# Altium footprint library master.PcbLib: 98 footprints (part 4 of 7)
Each footprint in its own frame and in the unit in brackets; x right, y up, seen from the top. Pads: shape width x height; smd on the part's side, far side on the other; paste and mask are expansions set on the pad; w line width, h text height; cw(c..) or ccw(c..) is an arc to the next point about the centre after c.
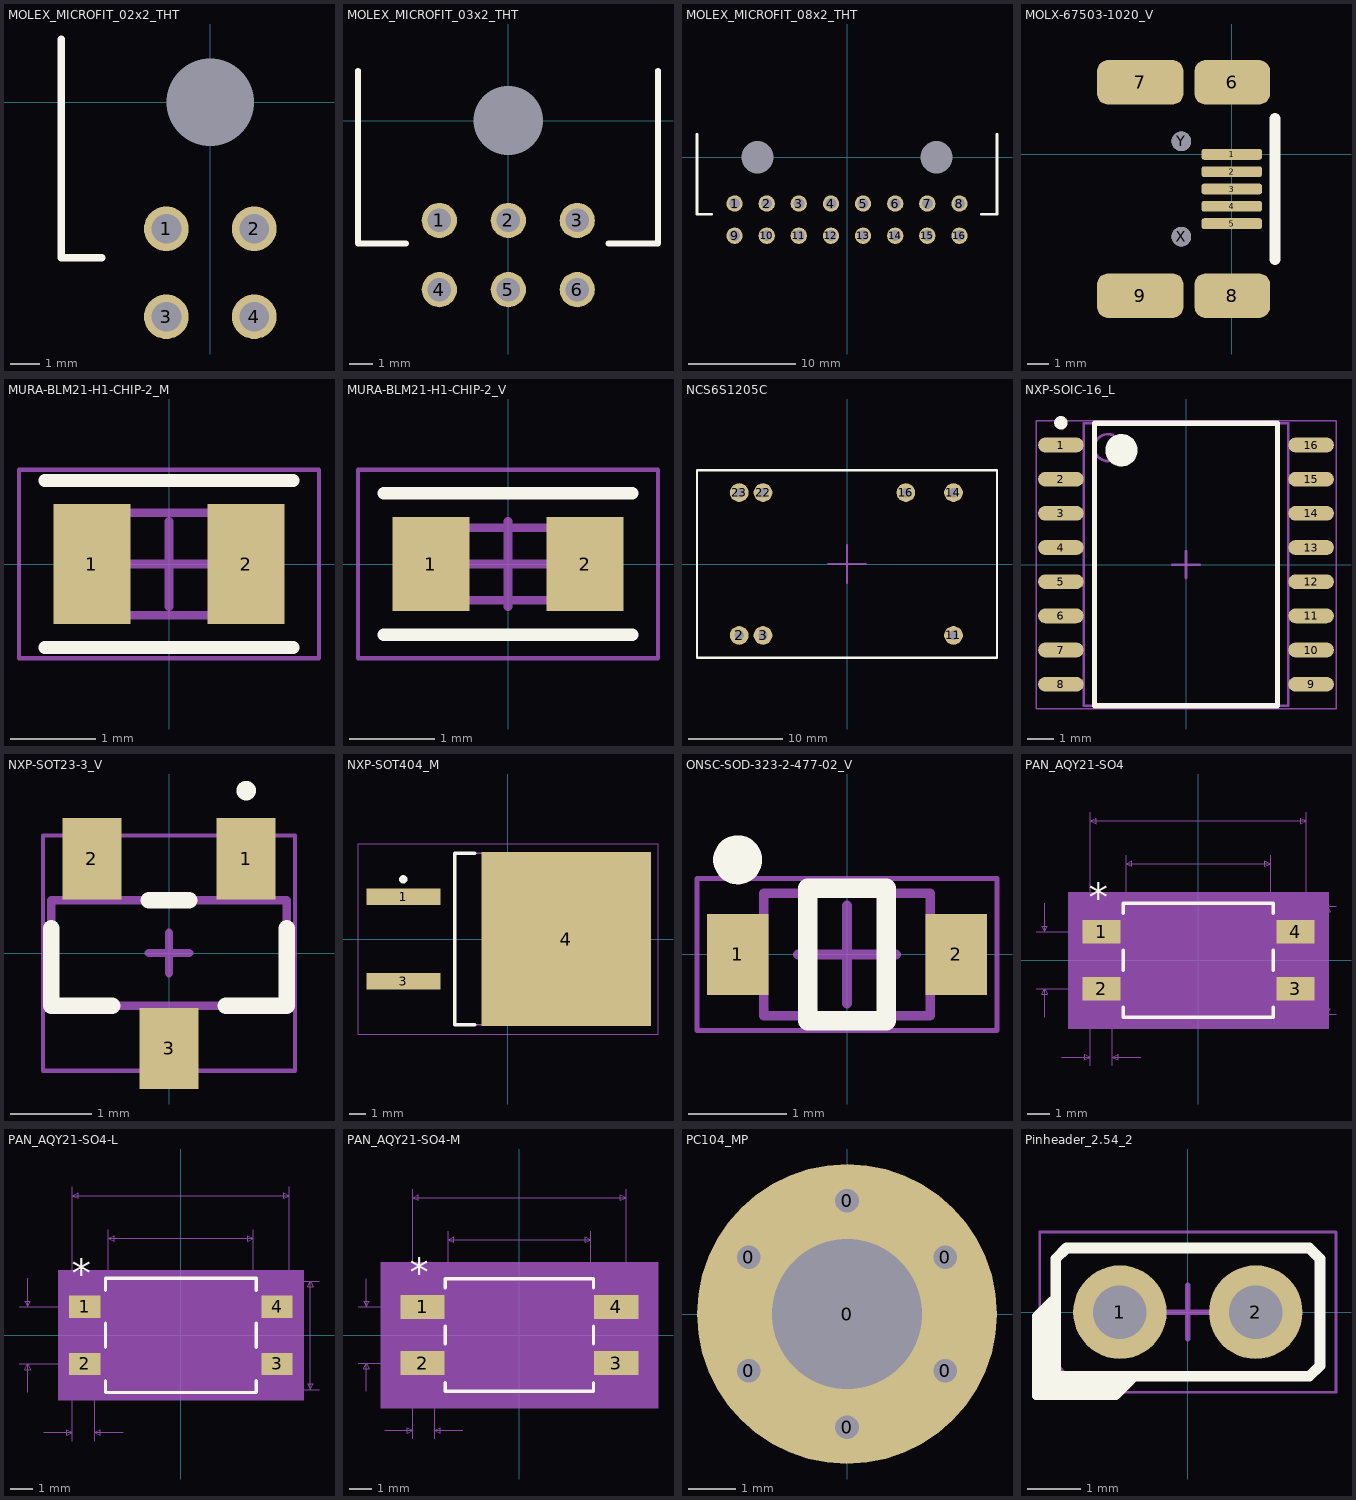
[diagram p3: the footprints below, top view; thin cyan lines are the x and y axes]

## MOLEX_MICROFIT_02x2_THT [mil] "Micro-Fit 3.0 Right Angle Header, 3.00mm Pitch, Dual Row, 4 Circuits, with Snap-in Plastic Peg PCB Lock, Tin, Glow Wire Capable, Black, 43045-0400"
height 345
pads (5):
  round 60 hole 40: 1(-59.02,-170) 2(59.02,-170) 3(-59.02,-287.99) 4(59.02,-287.99)
  round 39.37 hole 117.99 unplated paste+0 mask+4: ""(0,0)
Top Overlay:
  lines w10: -200,85 -200,-209.02 -146.02,-209.02
3D body "430450400.stp": height 345.35, standoff -125.12, extent -199.8,-300.95 199.8,180.94

## MOLEX_MICROFIT_03x2_THT [mil] "Micro-Fit 3.0 Right Angle Header, 3.00mm Pitch, Dual Row, 6 Circuits, with Snap-in Plastic Peg PCB Lock, Tin, Glow Wire Capable, Black, 43045-0600"
height 345
pads (7):
  round 60 hole 40: 1(-117.48,-170) 2(0,-170) 3(117.48,-170) 4(-117.48,-287.99) 5(0,-287.99) 6(117.48,-287.99)
  round 39.37 hole 117.99 unplated paste+0 mask+4: ""(0,0)
Top Overlay:
  lines w10: -256,85 -256,-209.02 -174,-209.02 ; 171,-209.02 255,-209.02 255,85
3D body "430450600.stp": height 345.35, standoff -125.12, extent -258.86,-300.95 258.86,180.94

## MOLEX_MICROFIT_08x2_THT [mil] "Micro-Fit 3.0 Right Angle Header, 3.00mm Pitch, Dual Row, 16 Circuits, with Snap-in Plastic Peg PCB Lock, Tin, Glow Wire Capable, Black, 43045-1600"
height 345
pads (18):
  round 60 hole 40: 1(-412.99,-170) 2(-295,-170) 3(-177.01,-170) 4(-59.02,-170) 5(59.02,-170) 6(177.01,-170) 7(295,-170) 8(412.99,-170) 9(-412.99,-287.99) 10(-295,-287.99) 11(-177.01,-287.99) 12(-59.02,-287.99) 13(59.02,-287.99) 14(177.01,-287.99) 15(295,-287.99) 16(412.99,-287.99)
  round 39.37 hole 117.99 unplated paste+0 mask+4: ""(-328.5,0) ""(328.5,0)
Top Overlay:
  lines w10: -551,85 -551,-209.02 -497,-209.02 ; 494,-209.02 551,-209.02 551,85
3D body "430451600.stp": height 345.35, standoff -125.12, extent -554.13,-300.95 554.13,180.94

## MOLX-67503-1020_V [mm] "Mini USB Connector, SMT, Righer Angle"
pads (11):
  rrect50% 2.8x0.5 smd: 1(0,0) 2(0,-0.8) 3(0,-1.6) 4(0,-2.4) 5(0,-3.2)
  rrect50% 3.5x2.05 smd: 6(0.025,3.325) 8(0.025,-6.525)
  rrect50% 4x2.05 smd: 7(-4.225,3.325) 9(-4.225,-6.525)
  round 0.9 hole 0.9 unplated: X(-2.325,-3.8) Y(-2.325,0.6)
Top Overlay:
  lines w0.5: 2,-4.85 2,1.65
3D body "USB Mini B - Connector.stp": height 3.95, standoff -1, extent -8.217,-6.557 0.783,3.343

## MURA-BLM21-H1-CHIP-2_M [mm] "Chip Ferrite Bead, 2-Leads, Body 2x1.25mm, Height 1.05mm Medium Density"
height 1.05
pads (2):
  rect 0.9x1.4 smd paste-10: 1(-0.9,0) 2(0.9,0)
Top Overlay:
  lines w0.15: -1.45,-0.975 1.45,-0.975 ; -1.45,0.975 1.45,0.975
Top Paste:
  region: 1.325,-0.675 1.325,0.675 0.729,0.675 0.45,0 0.729,-0.675
  region: -1.325,0.675 -1.325,-0.675 -0.729,-0.675 -0.45,0 -0.729,0.675
Mechanical 13:
  lines w0.1: -1,-0.6 1,-0.6 1,0.6 -1,0.6 -1,-0.6
Mechanical 15:
  lines w0.05: -1.75,-1.1 1.75,-1.1 1.75,1.1 -1.75,1.1 -1.75,-1.1
  lines w0.1: -0.5,0 0.5,0 ; 0,-0.5 0,0.5
3D body: height 0.85, standoff 0.05, extent -0.5,-0.6 0.5,0.6
3D body: height 0.9, standoff 0, extent -1,-0.625 -0.5,0.625
3D body: height 0.85, standoff 0, extent 0.5,-0.625 1,0.625

## MURA-BLM21-H1-CHIP-2_V [mm] "Chip Ferrite Bead, 2-Leads, Body 2x1.25mm, Height 1.05mm"
height 1.25
pads (2):
  rect 0.9x1.1 smd paste-10: 1(-0.9,0) 2(0.9,0)
Top Overlay:
  lines w0.15: -1.45,-0.825 1.45,-0.825 ; -1.45,0.825 1.45,0.825
Top Paste:
  region: -1.325,0.525 -1.325,-0.525 -0.667,-0.525 -0.45,0 -0.667,0.525
  region: 1.325,-0.525 1.325,0.525 0.667,0.525 0.45,0 0.667,-0.525
Mechanical 13:
  lines w0.1: -1,-0.425 -1,0.425 1,0.425 1,-0.425 -1,-0.425
Mechanical 15:
  lines w0.05: -1.75,-1.1 -1.75,1.1 1.75,1.1 1.75,-1.1 -1.75,-1.1
  lines w0.1: -0.5,0 0.5,0 ; 0,-0.5 0,0.5
3D body: height 1.2, standoff 0.05, extent -0.5,-0.4 0.5,0.4
3D body: height 1.25, standoff 0, extent 0.5,-0.425 1,0.425
3D body: height 1.25, standoff 0, extent -1,-0.425 -0.5,0.425

## NCS6S1205C [mm] "Isolated 6W 4:1 Input Single Output DC/DC Converter"
height 10.5
pads (7):
  round 2 hole 1: 2(-11.5,-7.62) 3(-8.96,-7.62) 11(11.36,-7.62) 14(11.36,7.62) 16(6.28,7.62) 22(-8.96,7.62) 23(-11.5,7.62)
Top Overlay:
  lines w0.254: -16,-10 16,-10 16,10 -16,10 -16,-10
Mechanical 15:
  lines w0.254: -2,0 -1.5,0 1.5,0 2,0 ; 0,-2 0,2
3D body "mps_dcdc_ncs6s_a.step": height 10.62, standoff -6.5, extent -16,-10 16,10

## NXP-SOIC-16_L [mm] "SOIC, 16-Leads, Body 10.5x7.6mm, Pitch 1.27mm, IPC High Density"
height 2.65
pads (16):
  oval 1.7x0.55 smd: 1(-4.65,4.445) 2(-4.65,3.175) 3(-4.65,1.905) 4(-4.65,0.635) 5(-4.65,-0.635) 6(-4.65,-1.905) 7(-4.65,-3.175) 8(-4.65,-4.445) 9(4.65,-4.445) 10(4.65,-3.175) 11(4.65,-1.905) 12(4.65,-0.635) 13(4.65,0.635) 14(4.65,1.905) 15(4.65,3.175) 16(4.65,4.445)
Top Overlay:
  circle w0.6: c-2.4,4.25 r0.3
  circle w0.25: c-4.65,5.27 r0.125
  lines w0.2: -3.4,-5.25 3.4,-5.25 3.4,5.25 -3.4,5.25 -3.4,-5.25
Mechanical 13:
  circle w0.1: c-2.9,4.35 r0.5
  lines w0.1: -3.8,-5.25 3.8,-5.25 3.8,5.25 -3.8,5.25 -3.8,-5.25
Mechanical 15:
  lines w0.05: -5.575,-5.35 5.575,-5.35 5.575,5.35 -5.575,5.35 -5.575,-5.35
  lines w0.1: -0.5,0 0.5,0 ; 0,-0.5 0,0.5
3D body "SOIC127P1030X265-16L.step": height 2.65, standoff 0, extent -5.162,-5.25 5.162,5.25

## NXP-SOT23-3_V [mm] "SOT23, 3-Leads, Body 1.3x2.9mm, Pitch 0.95mm"
height 1.1
pads (3):
  rect 0.725x1 smd: 1(0.95,1.16) 2(-0.95,1.16) 3(0,-1.175)
Top Overlay:
  circle w0.2: c0.95,2 r0.02
  lines w0.2: -1.45,0.304 -1.45,-0.65 -0.7,-0.65 ; -0.25,0.65 0.25,0.65 ; 0.7,-0.65 1.45,-0.65 1.45,0.304
Mechanical 13:
  lines w0.1: -1.45,-0.65 -1.45,0.65 1.45,0.65 1.45,-0.65 -1.45,-0.65
Mechanical 15:
  lines w0.05: -1.55,-1.45 1.55,-1.45 1.55,1.45 -1.55,1.45 -1.55,-1.45
  lines w0.1: -0.25,0 0.25,0 ; 0,-0.25 0,0.25
3D body: height 0.15, standoff 0, extent -0.225,-1.375 0.225,-0.875
3D body: height 1, standoff 0.05, extent -1.45,-0.65 1.45,0.65
3D body: height 0.5, standoff 0.35, extent -0.225,-0.875 0.225,-0.65
3D body: height 0.5, standoff 0, extent -0.225,-1.1 0.225,-0.875
3D body: height 0.5, standoff 0, extent 0.725,0.875 1.175,1.1
3D body: height 0.5, standoff 0.35, extent 0.725,0.65 1.175,0.875
3D body: height 0.15, standoff 0, extent 0.725,0.875 1.175,1.375
3D body: height 0.5, standoff 0, extent -1.175,0.875 -0.725,1.1
3D body: height 0.5, standoff 0.35, extent -1.175,0.65 -0.725,0.875
3D body: height 0.15, standoff 0, extent -1.175,0.875 -0.725,1.375

## NXP-SOT404_M [mm] "DPAK, 3-Leads, Body 10.3x9.8mm, Pitch 2.54mm, IPC Low Density"
height 4.5
pads (3):
  rect 4.45x1 smd: 1(-6.3,2.54) 3(-6.3,-2.54)
  rect 10.2x10.45 smd: 4(3.5,0)
Top Overlay:
  circle w0.25: c-6.3,3.59 r0.125
  lines w0.2: -2,-5.15 -3.2,-5.15 -3.2,5.15 -2,5.15
Mechanical 13:
  lines w0.1: -3.2,-5.15 6.6,-5.15 6.6,5.15 -3.2,5.15 -3.2,-5.15
Mechanical 15:
  lines w0.05: -9.025,-5.725 -9.025,5.725 9.025,5.725 9.025,-5.725 -9.025,-5.725
  lines w0.1: -0.5,0 0.5,0 ; 0,-0.5 0,0.5
3D body: height 4.5, standoff 0, extent -3.2,-5.15 6.6,5.15

## ONSC-SOD-323-2-477-02_V [mm] "SOD, 2-Leads, Body 1.7x1.25mm"
height 1.062
pads (2):
  rect 0.63x0.83 smd: 1(-1.115,0) 2(1.115,0)
Top Overlay:
  circle w0.25: c-1.115,0.965 r0.125
  lines w0.2: -0.4,-0.675 -0.4,0.675 0.4,0.675 0.4,-0.675 -0.4,-0.675
Mechanical 13:
  lines w0.1: -0.85,-0.625 -0.85,0.625 0.85,0.625 0.85,-0.625 -0.85,-0.625
Mechanical 15:
  lines w0.05: -1.53,-0.775 -1.53,0.775 1.53,0.775 1.53,-0.775 -1.53,-0.775
  lines w0.1: -0.5,0 0.5,0 ; 0,-0.5 0,0.5
3D body: height 1.06, standoff 0, extent -0.85,-0.625 0.85,0.625

## PAN_AQY21-SO4 [mil]
pads (4):
  rect 67x41 smd paste+0 mask+0: 1(-170.5,50) 2(-170.5,-50) 3(170.5,-50) 4(170.5,50)
Top Overlay:
  lines w6: -132,-82.61 -132,-100 132,-100 132,-82.61 ; -132,-17.39 -132,17.39 ; -132,82.61 -132,100 132,100 132,82.61 ; 132,-17.39 132,17.39
  text "*" at -193,86 h50
Mechanical 5:
  region: 229,-120 -229,-120 -229,120 229,120
Mechanical 7:
  lines w1: -285.5,-50 -170.5,-50 ; -285.5,50 -170.5,50 ; -270.5,-100 -270.5,-50 ; -270.5,100 -270.5,50 ; -240,-170 -190,-170 ; -190,-185 -190,0 -190,260 ; -151,-185 -151,0 ; -127,0 -127,185 ; -101,-170 -151,-170 ; 0,-95 242,-95 ; 0,95 242,95 ; 127,0 127,185 ; 190,0 190,260 ; -270.5,-50 -275.5,-60 -265.5,-60 -270.5,-50 ; -270.5,50 -275.5,60 -265.5,60 -270.5,50 ; -190,-170 -200,-165 -200,-175 -190,-170 ; -190,245 190,245 ; -190,245 -180,250 -180,240 -190,245 ; -151,-170 -141,-165 -141,-175 -151,-170 ; -127,170 127,170 ; -127,170 -117,175 -117,165 -127,170 ; 127,170 117,175 117,165 127,170 ; 190,245 180,250 180,240 190,245 ; 227,-95 227,95 ; 227,-95 222,-85 232,-85 227,-95 ; 227,95 222,85 232,85 227,95
  text "Default Padstyle: RX67Y41D0T" at -350,-295 h50
  text "Pin One Padstyle: RX67Y41D0T" at -350,-355 h50
  text "Alt 1 Padstyle: OX60Y90D30P" at -337.5,-535 h50
  text "Alt 2 Padstyle: OX90Y60D30P" at -337.5,-595 h50
  text "0.254in/6.452mm" at -93.75,190 h25
  text "0.38in/9.652mm" at -87.5,265 h25
  text "0.19in/4.826mm" at 247,-12.5 h25
  text "0.1in/2.54mm" at -440.5,-12.5 h25
  text "0.039in/0.991mm" at -264.25,-215 h25
Mechanical 13:
  lines w0: -12,95 ccw(c0,95) 12,95
  lines w1: -190,-69.5 -190,-30.5 -127,-30.5 -127,-69.5 -190,-69.5 ; -190,30.5 -190,69.5 -127,69.5 -127,30.5 -190,30.5 ; -127,-95 127,-95 127,95 -127,95 -127,-95 ; 127,-69.5 127,-30.5 190,-30.5 190,-69.5 127,-69.5 ; 127,30.5 127,69.5 190,69.5 190,30.5 127,30.5
  text "*" at -124.5,42 h50
Mechanical 15:
  region: -137,-80.5 -214,-80.5 -214,80.5 -137,80.5 -137,105 137,105 137,80.5 214,80.5 214,-80.5 137,-80.5 137,-105 -137,-105
  lines w6: -214,-80.5 -214,80.5 -137,80.5 -137,105 137,105 137,80.5 214,80.5 214,-80.5 137,-80.5 137,-105 -137,-105 -137,-80.5 -214,-80.5
3D body "PAN_AQY21-SO4.step": height 136.1, standoff 0, extent -189.99,-94.99 190.01,95
3D body: height 10, standoff 0, extent 0,0 10,10

## PAN_AQY21-SO4-L [mil]
pads (4):
  rect 55x39 smd paste+0 mask+0: 1(-168.5,50) 2(-168.5,-50) 3(168.5,-50) 4(168.5,50)
Top Overlay:
  lines w6: -132,-79.02 -132,-100 132,-100 132,-79.02 ; -132,-20.98 -132,20.98 ; -132,79.02 -132,100 132,100 132,79.02 ; 132,-20.98 132,20.98
  text "*" at -191,84 h50
Mechanical 5:
  region: 215,-114 -215,-114 -215,114 215,114
Mechanical 7:
  lines w1: -283.5,-50 -168.5,-50 ; -283.5,50 -168.5,50 ; -268.5,-100 -268.5,-50 ; -268.5,100 -268.5,50 ; -240,-170 -190,-170 ; -190,-185 -190,0 -190,260 ; -151,-185 -151,0 ; -127,0 -127,185 ; -101,-170 -151,-170 ; 0,-95 242,-95 ; 0,95 242,95 ; 127,0 127,185 ; 190,0 190,260 ; -268.5,-50 -273.5,-60 -263.5,-60 -268.5,-50 ; -268.5,50 -273.5,60 -263.5,60 -268.5,50 ; -190,-170 -200,-165 -200,-175 -190,-170 ; -190,245 190,245 ; -190,245 -180,250 -180,240 -190,245 ; -151,-170 -141,-165 -141,-175 -151,-170 ; -127,170 127,170 ; -127,170 -117,175 -117,165 -127,170 ; 127,170 117,175 117,165 127,170 ; 190,245 180,250 180,240 190,245 ; 227,-95 227,95 ; 227,-95 222,-85 232,-85 227,-95 ; 227,95 222,85 232,85 227,95
  text "Default Padstyle: RX55Y39D0T" at -350,-295 h50
  text "Pin One Padstyle: RX55Y39D0T" at -350,-355 h50
  text "Alt 1 Padstyle: OX60Y90D30P" at -337.5,-535 h50
  text "Alt 2 Padstyle: OX90Y60D30P" at -337.5,-595 h50
  text "0.254in/6.452mm" at -93.75,190 h25
  text "0.38in/9.652mm" at -87.5,265 h25
  text "0.19in/4.826mm" at 247,-12.5 h25
  text "0.1in/2.54mm" at -438.5,-12.5 h25
  text "0.039in/0.991mm" at -264.25,-215 h25
Mechanical 13:
  lines w0: -12,95 ccw(c0,95) 12,95
  lines w1: -190,-69.5 -190,-30.5 -127,-30.5 -127,-69.5 -190,-69.5 ; -190,30.5 -190,69.5 -127,69.5 -127,30.5 -190,30.5 ; -127,-95 127,-95 127,95 -127,95 -127,-95 ; 127,-69.5 127,-30.5 190,-30.5 190,-69.5 127,-69.5 ; 127,30.5 127,69.5 190,69.5 190,30.5 127,30.5
  text "*" at -124.5,42 h50
Mechanical 15:
  region: -131,-73.5 -200,-73.5 -200,73.5 -131,73.5 -131,99 131,99 131,73.5 200,73.5 200,-73.5 131,-73.5 131,-99 -131,-99
  lines w6: -200,-73.5 -200,73.5 -131,73.5 -131,99 131,99 131,73.5 200,73.5 200,-73.5 131,-73.5 131,-99 -131,-99 -131,-73.5 -200,-73.5
3D body: height 10, standoff 0, extent 0,0 10,10

## PAN_AQY21-SO4-M [mil]
pads (4):
  rect 79x43 smd paste+0 mask+0: 1(-172.5,50) 2(-172.5,-50) 3(172.5,-50) 4(172.5,50)
Top Overlay:
  lines w6: -132,-84.56 -132,-100 132,-100 132,-84.56 ; -132,-15.44 -132,15.44 ; -132,84.56 -132,100 132,100 132,84.56 ; 132,-15.44 132,15.44
  text "*" at -195,88 h50
Mechanical 5:
  region: 247,-130 -247,-130 -247,130 247,130
Mechanical 7:
  lines w1: -287.5,-50 -172.5,-50 ; -287.5,50 -172.5,50 ; -272.5,-100 -272.5,-50 ; -272.5,100 -272.5,50 ; -240,-170 -190,-170 ; -190,-185 -190,0 -190,260 ; -151,-185 -151,0 ; -127,0 -127,185 ; -101,-170 -151,-170 ; 0,-95 242,-95 ; 0,95 242,95 ; 127,0 127,185 ; 190,0 190,260 ; -272.5,-50 -267.5,-60 -277.5,-60 -272.5,-50 ; -272.5,50 -267.5,60 -277.5,60 -272.5,50 ; -190,-170 -200,-175 -200,-165 -190,-170 ; -190,245 -180,240 -180,250 -190,245 ; -190,245 190,245 ; -151,-170 -141,-175 -141,-165 -151,-170 ; -127,170 -117,165 -117,175 -127,170 ; -127,170 127,170 ; 127,170 117,165 117,175 127,170 ; 190,245 180,240 180,250 190,245 ; 227,-95 232,-85 222,-85 227,-95 ; 227,-95 227,95 ; 227,95 232,85 222,85 227,95
  text "0.039in/0.991mm" at -264.25,-215 h25
  text "0.1in/2.54mm" at -442.5,-12.5 h25
  text "0.19in/4.826mm" at 247,-12.5 h25
  text "0.38in/9.652mm" at -87.5,265 h25
  text "0.254in/6.452mm" at -93.75,190 h25
  text "Alt 2 Padstyle: OX90Y60D30P" at -337.5,-595 h50
  text "Alt 1 Padstyle: OX60Y90D30P" at -337.5,-535 h50
  text "Pin One Padstyle: RX79Y43D0T" at -350,-355 h50
  text "Default Padstyle: RX79Y43D0T" at -350,-295 h50
Mechanical 13:
  lines w0: -12,95 ccw(c0,95) 12,95
  lines w1: -190,-69.5 -127,-69.5 -127,-30.5 -190,-30.5 -190,-69.5 ; -190,30.5 -127,30.5 -127,69.5 -190,69.5 -190,30.5 ; -127,-95 -127,95 127,95 127,-95 -127,-95 ; 127,-69.5 190,-69.5 190,-30.5 127,-30.5 127,-69.5 ; 127,30.5 190,30.5 190,69.5 127,69.5 127,30.5
  text "*" at -124.5,42 h50
Mechanical 15:
  region: -147,-91.5 -232,-91.5 -232,91.5 -147,91.5 -147,115 147,115 147,91.5 232,91.5 232,-91.5 147,-91.5 147,-115 -147,-115
  lines w6: -232,-91.5 -147,-91.5 -147,-115 147,-115 147,-91.5 232,-91.5 232,91.5 147,91.5 147,115 -147,115 -147,91.5 -232,91.5 -232,-91.5
3D body: height 10, standoff 0, extent 0,0 10,10

## PC104_MP [mm]
pads (7):
  round 0.8 hole 0.5: 0(-2.078,-1.2) 0(-2.078,1.2) 0(0,-2.4) 0(0,2.4) 0(2.078,-1.2) 0(2.078,1.2)
  round 6.35 hole 3.18: 0(0,0)

## Pinheader_2.54_2 [mm] "Pinheader, 2.54mm, gerade"
height 8.7
pads (2):
  round 1.75 hole 1: 1(-1.27,0) 2(1.27,0)
Top Overlay:
  region: -2.54,0.23 -2.54,-1.27 -1.04,-1.27 -1.34,-1.57 -2.84,-1.57 -2.84,-0.07
  lines w0.15: -2.54,0.23 -2.84,-0.07 -2.84,-1.57 -1.34,-1.57 -1.04,-1.27
  lines w0.2: -2.47,-1.2 -2.47,1 -2.27,1.2 2.27,1.2 2.47,1 2.47,-1 2.27,-1.2 -2.47,-1.2
Mechanical 13:
  lines w0.1: -2.47,-1 -2.47,1 -2.27,1.2 2.27,1.2 2.47,1 2.47,-1 2.27,-1.2 -2.27,-1.2 -2.47,-1
Mechanical 15:
  lines w0.05: -2.77,-1.5 -2.77,1.5 2.77,1.5 2.77,-1.5 -2.77,-1.5
  lines w0.1: -0.5,0 0.5,0 ; 0,-0.5 0,0.5
3D body "stiftleiste_254_gerade_2.stp": height 8.74, standoff -2.86, extent -2.54,-1.27 2.54,1.27